# Altium footprint library custom.PcbLib: 317 footprints (part 14 of 20)
Each footprint in its own frame and in the unit in brackets; x right, y up, seen from the top. Pads: shape width x height; smd on the part's side, far side on the other; paste and mask are expansions set on the pad; w line width, h text height; cw(c..) or ccw(c..) is an arc to the next point about the centre after c.
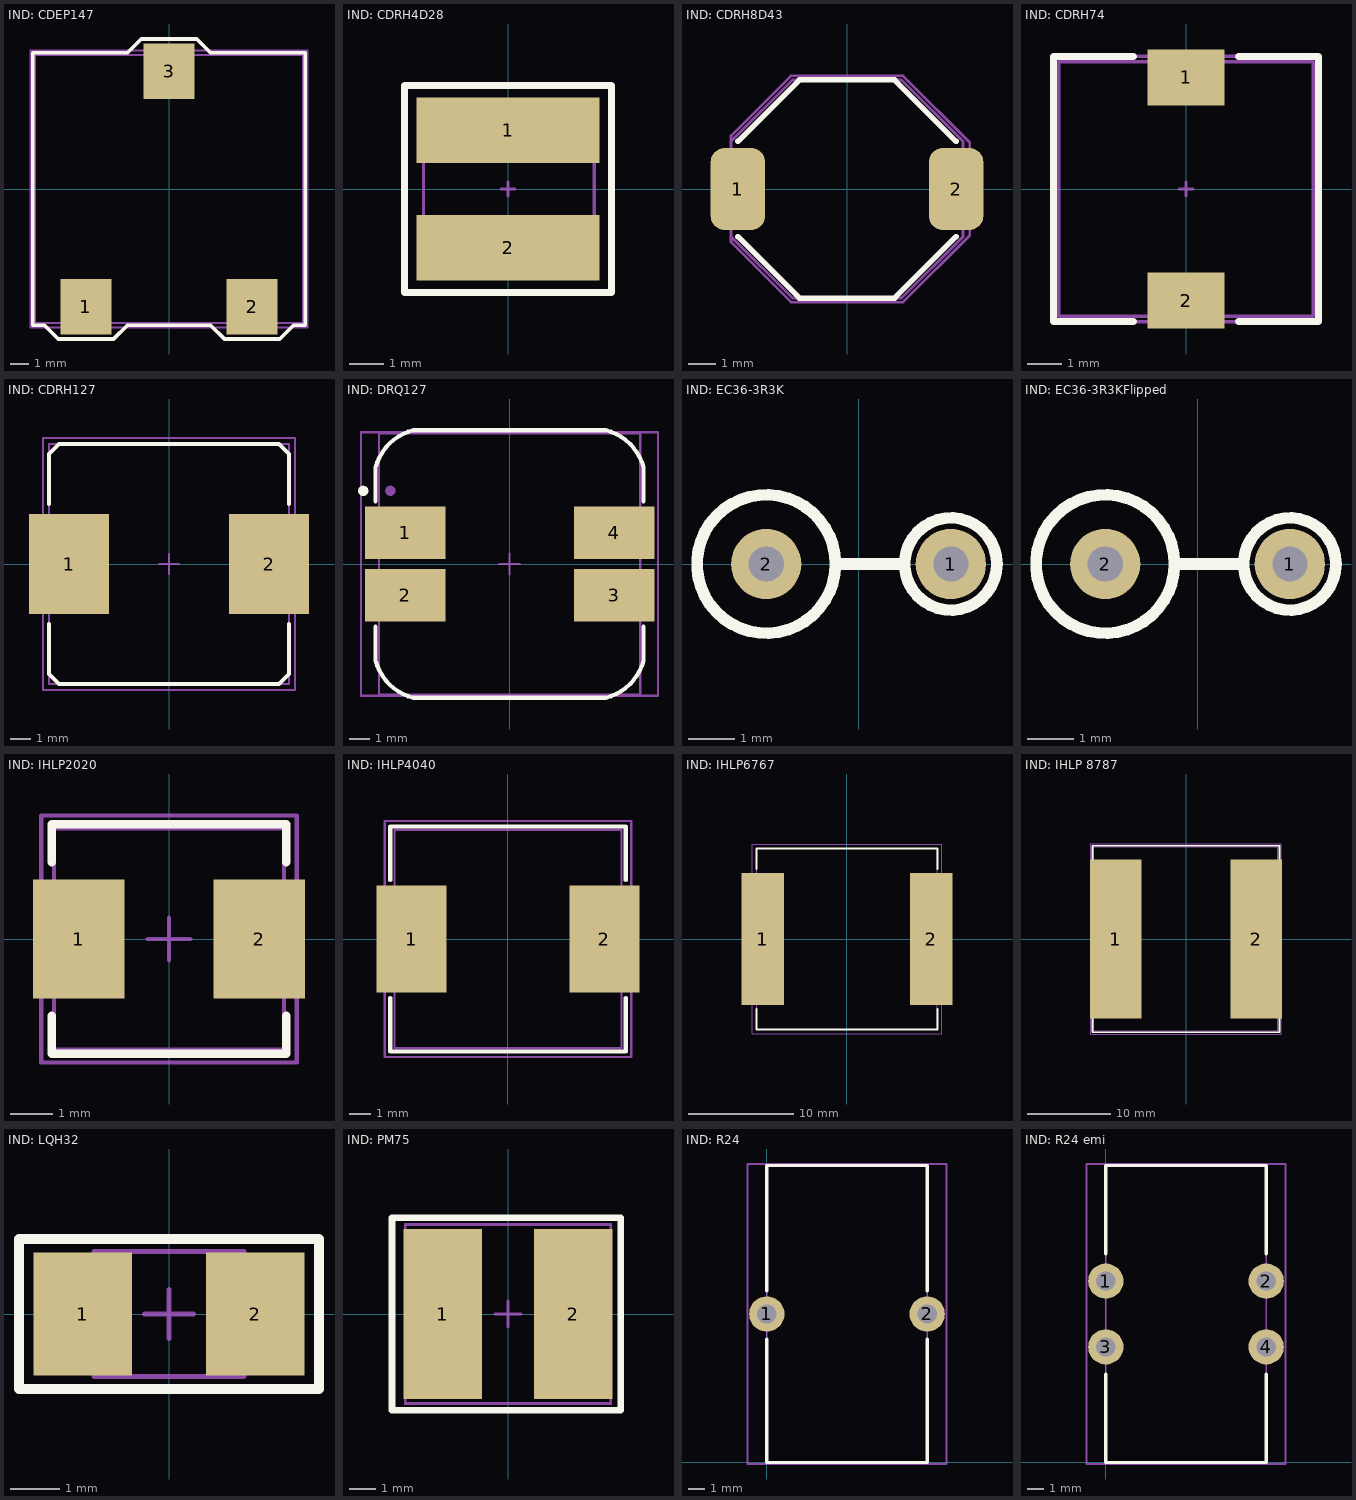
[diagram p13: the footprints below, top view; thin cyan lines are the x and y axes]

## IND: CDEP147 [mm]
height 8
pads (3):
  rect 2.75x3 smd: 1(-4.5,-6.375) 2(4.5,-6.375) 3(0,6.375)
Top Overlay:
  lines w0.2: -7.375,-7.375 -7.375,7.375 -2.25,7.375 -1.5,8.125 1.5,8.125 2.25,7.375 7.375,7.375 7.375,-7.375 6.75,-7.375 6,-8.125 3,-8.125 2.25,-7.375 -2.25,-7.375 -3,-8.125 -6,-8.125 -6.75,-7.375 -7.375,-7.375
Top Assy:
  lines w0.1: -7.25,-7.25 7.25,-7.25 7.25,7.25 -7.25,7.25 -7.25,-7.25
Size Area:
  lines w0.1: -7.5,-7.5 7.5,-7.5 7.5,7.5 -7.5,7.5 -7.5,-7.5
3D body "CDEP147.STEP": height 8.05, standoff 0.05, extent -7.25,-7.25 7.25,7.25

## IND: CDRH4D28 [mm]
pads (2):
  rect 5.3x1.9 smd: 1(0,1.7) 2(0,-1.7)
Top Overlay:
  lines w0.2: -3,-3 -3,3 3,3 3,-3 -3,-3
Top Assy:
  lines w0.1: -2.45,-2.5 2.5,-2.5 2.5,2.5 -2.45,2.5 -2.45,-2.5
Size Area:
  lines w0.1: -0.2,0 0.2,0 ; 0,-0.2 0,0.2 ; -3,-3 3,-3 3,3 -3,3 -3,-3
3D body "User Library-CDRH4D28.STEP": height 2.91, standoff 0, extent -2.45,-2.45 2.45,2.45

## IND: CDRH8D43 [mm] "SMD inductor, 8x8x4 mm"
height 4.7
pads (2):
  rrect50% 2x3 smd: 1(-4,0) 2(4,0)
Top Overlay:
  lines w0.2: -4,-1.75 -1.75,-4 1.75,-4 4,-1.75 ; -4,1.75 -1.75,4 1.75,4 4,1.75
Top Assy:
  lines w0.1: -4.25,-1.75 -4.25,1.75 ; -4.225,1.775 -2,4 2,4 4.207,1.793 ; -4.207,-1.793 -2,-4 2,-4 4.225,-1.775 ; 4.25,-1.75 4.25,1.75
Size Area:
  lines w0.1: -4.25,-1.95 -4.25,1.95 -2.05,4.15 2.05,4.15 4.5,1.7 4.5,-1.7 2.05,-4.15 -2.05,-4.15 -4.25,-1.95
3D body "CDRH8D43.STEP": height 4.53, standoff 0.03, extent -4.342,-4 4.343,4

## IND: CDRH74 [mm]
height 4.5
pads (2):
  rect 2.2x1.6 smd: 1(0,3.2) 2(0,-3.2)
Top Overlay:
  lines w0.2: -1.5,-3.8 -3.8,-3.8 -3.8,3.8 -1.5,3.8 ; 1.5,-3.8 3.8,-3.8 3.8,3.8 1.5,3.8
Top Assy:
  lines w0.1: -3.65,-3.65 3.65,-3.65 3.65,3.65 -3.65,3.65 -3.65,-3.65
Size Area:
  lines w0.1: -0.2,0 0.2,0 ; 0,-0.2 0,0.2 ; -3.8,-3.8 3.8,-3.8 3.8,3.8 -3.8,3.8 -3.8,-3.8
3D body "User Library-CDRH74NP-220MC.step": height 4.5, standoff 0, extent -3.65,-3.65 3.65,3.65

## IND: CDRH127 [mm]
height 8.5
pads (2):
  rect 4x5 smd: 1(-5,0) 2(5,0)
Top Overlay:
  lines w0.2: -6,-3 -6,-5.5 -5.5,-6 5.5,-6 6,-5.5 6,-3 ; -6,3 -6,5.5 -5.5,6 5.5,6 6,5.5 6,3
Top Assy:
  lines w0.1: -6,-6 6,-6 6,6 -6,6 -6,-6
Size Area:
  lines w0.1: -0.5,0 0.5,0 ; 0,-0.5 0,0.5 ; -6.3,-6.3 -6.3,6.3 6.3,6.3 6.3,-6.3 -6.3,-6.3
3D body "CDRH127-2.step": height 8.05, standoff 0.05, extent -6,-6 6,6

## IND: DRQ127 [mm] "Inductor"
height 5.1
pads (6):
  rect 3.85x2.5 smd: 1(-5,1.5) 2(-5,-1.5) 3(5,-1.5) 4(5,1.5)
  round 0.5 on Top Overlay: ""(-7,3.5)
  round 0.5 on Mech1: ""(-5.7,3.5)
Top Overlay:
  lines w0.2: -6.408,-3 -6.408,-4.625 ccw(c-3.994,-3.975) -4.6,-6.4 ; -6.408,3 -6.408,4.625 cw(c-3.994,3.975) -4.6,6.4 ; -4.606,-6.4 4.6,-6.4 ccw(c3.994,-3.975) 6.408,-4.625 6.408,-3 ; -4.606,6.4 4.6,6.4 cw(c3.994,3.975) 6.408,4.625 6.408,3
Top Assy:
  lines w0.1: -6.25,-6.25 -6.25,6.25 6.25,6.25 6.25,-6.25 -6.25,-6.25
Size Area:
  lines w0.1: -0.5,0 0.5,0 ; 0,-0.5 0,0.5 ; -7.1,-6.3 7.1,-6.3 7.1,6.3 -7.1,6.3 -7.1,-6.3
3D body "SW3dPS-DRQ127_12.5x12.5.STEP": height 8, standoff 0, extent -6.25,-6.25 6.25,6.25

## IND: EC36-3R3K [mil] "Inductor up"
pads (2):
  round 60 hole 30: 1(78.74,0) 2(-78.74,0)
Top Overlay:
  circle w10: c-78.74,0 r59.06
  circle w10: c78.74,0 r39.37
  lines w10: -19.29,0 39.37,0
3D body "EC36-3R3K.SLDPRT": height 562.95, standoff -78.74, extent -137.52,-58.43 84.65,58.9

## IND: EC36-3R3KFlipped [mil] "Inductor down"
pads (2):
  round 60 / inner round 60 / far side round 0 hole 30 unplated: 1(78.74,0) 2(-78.74,0)
Top Overlay:
  circle w10: c78.74,0 r39.37
  circle w10: c-78.74,0 r59.06
  lines w10: -19.29,0 39.37,0
3D body "EC36-3R3K.SLDPRT": height 39.37, standoff -602.32, extent -137.52,-58.9 84.65,58.43

## IND: IHLP2020 [mm] "SMD inductor, 5.2x5.2x3 mm"
height 3
pads (2):
  rect 2.15x2.8 smd: 1(-2.125,0) 2(2.125,0)
Top Overlay:
  lines w0.2: -2.75,-1.8 -2.75,-2.7 2.75,-2.7 2.75,-1.8 ; -2.75,1.8 -2.75,2.7 2.75,2.7 2.75,1.8
Top Assy:
  lines w0.1: -2.7,-2.6 2.7,-2.6 2.7,2.6 -2.7,2.6 -2.7,-2.6
Size Area:
  lines w0.1: -0.5,0 0.5,0 ; 0,-0.5 0,0.5 ; -3,-2.9 3,-2.9 3,2.9 -3,2.9 -3,-2.9
3D body "IHLP-2020.stp": height 2.89, standoff 0.03, extent -2.725,-2.571 2.725,2.575

## IND: IHLP4040 [mm] "SMD inductor, 10.3x10.8x4 mm"
height 4
pads (2):
  rect 3.25x5 smd: 1(-4.5,0) 2(4.5,0)
Top Overlay:
  lines w0.2: -5.5,-2.75 -5.5,-5.25 5.5,-5.25 5.5,-2.75 ; -5.5,2.75 -5.5,5.25 5.5,5.25 5.5,2.75
Top Assy:
  lines w0.1: -5.3,-5.1 -5.3,5.1 5.3,5.1 5.3,-5.1 -5.3,-5.1
Size Area:
  lines w0.1: -5.75,-5.5 -5.75,5.5 5.75,5.5 5.75,-5.5 -5.75,-5.5
3D body "IHLP-4040.stp": height 3.94, standoff 0.06, extent -5.311,-5.1 5.311,5.116

## IND: IHLP6767 [mm] "SMT inductor, 17x17x7 mm"
height 7
pads (2):
  rect 4x12.5 smd: 1(-8,0) 2(8,0)
Top Overlay:
  lines w0.2: -8.6,-6.65 -8.6,-8.6 8.6,-8.6 8.6,-6.65 ; -8.6,6.65 -8.6,8.6 8.6,8.6 8.6,6.65
Top Assy:
  lines w0.1: -8.588,-8.576 8.588,-8.576 8.588,8.6 -8.588,8.6 -8.588,-8.576
Size Area:
  lines w0.1: -9,-9 -9,9 9,9 9,-9 -9,-9
3D body "IHLP6767.stp": height 6.99, standoff 0.1, extent -8.588,-8.576 8.588,8.6

## IND: IHLP 8787 [mm] "SMT inductor, 22.5x22x13 mm"
height 13
pads (2):
  rect 6.25x19.25 smd: 1(-8.5,0) 2(8.5,0)
Top Overlay:
  lines w0.2: -11.3,-9.5 -11.3,-11.25 11.3,-11.25 11.3,-9.5 ; -11.3,9.5 -11.3,11.25 11.3,11.25 11.3,9.5
Top Assy:
  lines w0.1: -11.158,-11.112 -11.158,11.143 11.097,11.143 11.097,-11.112 -11.158,-11.112
Size Area:
  lines w0.1: -11.5,-11.5 -11.5,11.5 11.5,11.5 11.5,-11.5 -11.5,-11.5
3D body "IHLP8787MZ.STEP": height 12.9, standoff 0.02, extent -11.158,-11.112 11.097,11.143

## IND: LQH32 [mm]
height 4
pads (2):
  rect 2x2.5 smd: 1(-1.75,0) 2(1.75,0)
Top Overlay:
  lines w0.2: -3.048,-1.524 -3.048,1.524 3.048,1.524 3.048,-1.524 -3.048,-1.524
Top Assy:
  lines w0.1: -1.524,-1.27 1.524,-1.27 1.524,1.27 -1.524,1.27 -1.524,-1.27
Size Area:
  lines w0.1: -0.5,0 0.5,0 ; 0,-0.5 0,0.5 ; -3.048,-1.524 -3.048,1.524 3.048,1.524 3.048,-1.524 -3.048,-1.524
3D body "��������_���_25_3.STEP": height 2.5, standoff 0, extent -1.5,-1.25 1.5,1.25

## IND: PM75 [mm]
height 15
pads (2):
  rect 3x6.5 smd: 1(-2.5,0) 2(2.5,0)
Top Overlay:
  lines w0.254: -4.445,-3.683 -4.445,3.683 4.318,3.683 4.318,-3.683 -4.445,-3.683
Top Assy:
  lines w0.1: -3.937,-3.429 -3.937,3.429 3.937,3.429 3.937,-3.429 -3.937,-3.429
Size Area:
  lines w0.05: -4.445,-3.683 4.318,-3.683 4.318,3.683 -4.445,3.683 -4.445,-3.683
  lines w0.1: -0.5,0 0.5,0 ; 0,-0.5 0,0.5
3D body "PM75 series bourns inductor.STEP": height 5, standoff 0, extent -3.868,-3.5 3.868,3.5

## IND: R24 [mm]
height 24
pads (2):
  round 2.2 hole 1.2: 1(0,9.25) 2(10,9.25)
Top Overlay:
  lines w0.2: 0,7.7 0,0 10,0 10,7.7 ; 0,10.7 0,18.5 10,18.5 10,10.7
Top Assy:
  lines w0.1: 10,18.5 10,0 0,0 0,18.5 10,18.5 ; 10,18.5 10,18.5
Size Area:
  lines w0.1: -1.2,-0.1 11.2,-0.1 11.2,18.6 -1.2,18.6 -1.2,-0.1
3D body "User Library-coilD17H9.STEP": height 18.25, standoff -3, extent 0,0 10,18.5

## IND: R24 emi [mm]
height 24
pads (4):
  round 2.2 hole 1.2: 1(0,11.3) 2(10,11.3) 3(0,7.2) 4(10,7.2)
Top Overlay:
  lines w0.2: 0,5.5 0,0 10,0 10,5.5 ; 0,13 0,18.5 10,18.5 10,13
Top Assy:
  lines w0.1: 10,18.5 0,18.5 0,0 10,0 10,18.5 ; 10,18.5 10,18.5
Size Area:
  lines w0.1: -1.2,-0.1 -1.2,18.6 11.2,18.6 11.2,-0.1 -1.2,-0.1
3D body "User Library-coilD17H9.STEP": height 18.25, standoff -3, extent 0,0 10,18.5